# Altium footprint library Pcb.PcbLib: 234 footprints (part 14 of 15)
Each footprint in its own frame and in the unit in brackets; x right, y up, seen from the top. Pads: shape width x height; smd on the part's side, far side on the other; paste and mask are expansions set on the pad; w line width, h text height; cw(c..) or ccw(c..) is an arc to the next point about the centre after c.
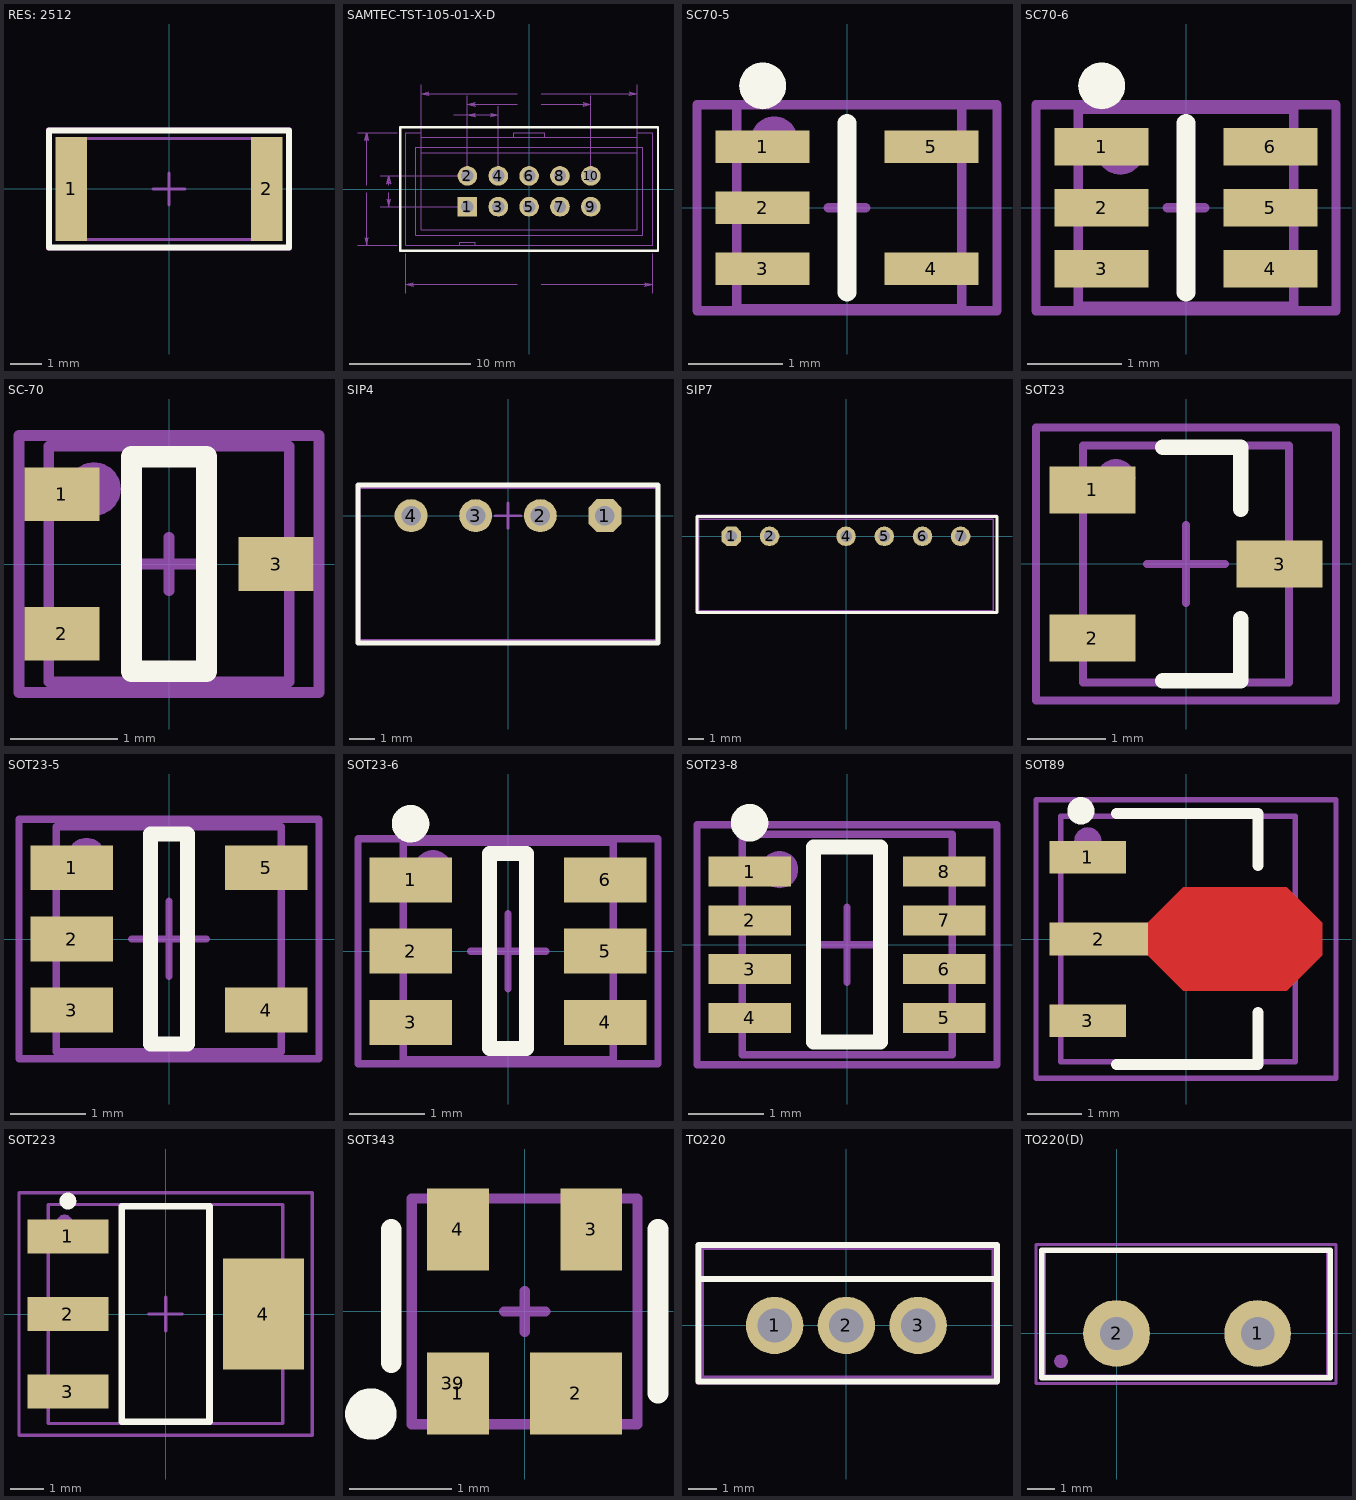
[diagram p13: the footprints below, top view; thin cyan lines are the x and y axes]

## RES: 2512 [mm]
height 0.55
pads (2):
  rect 1x3.3 smd: 1(-3.1,0) 2(3.1,0)
Top Overlay:
  lines w0.2: -3.8,-1.85 -3.8,1.85 3.8,1.85 3.8,-1.85 -3.8,-1.85
Mechanical 1:
  lines w0.1: -3.175,-1.6 -3.175,1.6 3.175,1.6 3.175,-1.6 -3.175,-1.6
Top Courtyard:
  lines w0.1: -0.5,0 0.5,0 ; 0,-0.5 0,0.5 ; -3.85,-1.9 3.85,-1.9 3.85,1.9 -3.85,1.9 -3.85,-1.9
3D body "chip_2512_r.STEP": height 0.52, standoff -0.04, extent -3.175,-1.6 3.175,1.6

## SAMTEC-TST-105-01-X-D [mm]
pads (10):
  rect 1.62x1.62 / inner round 1.524 / far side round 1.62 hole 1.02: 1(-5.08,-1.46)
  round 1.62 / inner round 1.524 / far side round 1.62 hole 1.02: 2(-5.08,1.08) 3(-2.54,-1.46) 4(-2.54,1.08) 5(0,-1.46) 6(0,1.08) 7(2.54,-1.46) 8(2.54,1.08) 9(5.08,-1.46) 10(5.08,1.08)
Top Overlay:
  lines w0.2: -10.61,-5.086 -10.61,5.086 10.61,5.086 10.61,-5.086 -10.61,-5.086
Top Solder:
  circle w0: c5.08,1.08 r0.861
  circle w0: c5.08,-1.46 r0.861
  circle w0: c2.54,1.08 r0.861
  circle w0: c2.54,-1.46 r0.861
  circle w0: c0,1.08 r0.861
  circle w0: c0,-1.46 r0.861
  circle w0: c-2.54,1.08 r0.861
  circle w0: c-2.54,-1.46 r0.861
  circle w0: c-5.08,1.08 r0.861
  circle w0: c-5.08,-1.46 r0.861
Bottom Solder:
  circle w0: c5.08,1.08 r0.861
  circle w0: c5.08,-1.46 r0.861
  circle w0: c2.54,1.08 r0.861
  circle w0: c2.54,-1.46 r0.861
  circle w0: c0,1.08 r0.861
  circle w0: c0,-1.46 r0.861
  circle w0: c-2.54,1.08 r0.861
  circle w0: c-2.54,-1.46 r0.861
  circle w0: c-5.08,1.08 r0.861
  circle w0: c-5.08,-1.46 r0.861
Mechanical 3:
  lines w0.1: -5.715,-4.636 -5.715,-4.382 ; -5.715,-4.636 -5.715,-4.382 ; -5.715,-4.636 -4.445,-4.636 ; -5.715,-4.636 -10.16,-4.636 -10.16,4.636 -8.89,4.636 -8.89,4.254 -3.81,4.254 -1.27,4.254 ; -5.715,-4.382 -4.445,-4.382 ; -5.715,-4.382 -4.445,-4.382 ; -4.445,-4.636 -3.81,-4.636 -1.27,-4.636 1.27,-4.636 3.81,-4.636 10.16,-4.636 10.16,4.636 8.89,4.636 8.89,4.254 3.81,4.254 1.27,4.254 ; -4.445,-4.636 -4.445,-4.382 ; -4.445,-4.636 -4.445,-4.382 ; -1.27,4.254 -1.27,4.636 1.27,4.636 1.27,4.254 ; -1.27,4.254 1.27,4.254 ; 4.762,0.762 5.398,0.762 ; 4.762,0.762 4.762,1.397 5.398,1.397 5.398,0.762 ; 4.762,0.762 5.398,0.762 ; -9.335,-3.81 -3.81,-3.81 -1.27,-3.81 1.27,-3.81 3.81,-3.81 9.335,-3.81 9.335,3.429 3.81,3.429 1.27,3.429 -1.27,3.429 -3.81,3.429 -9.335,3.429 -9.335,-3.81 ; -8.89,-3.366 -8.89,2.984 -3.81,2.984 -1.27,2.984 1.27,2.984 3.81,2.984 8.89,2.984 8.89,-3.366 3.81,-3.366 1.27,-3.366 -1.27,-3.366 -3.81,-3.366 -8.89,-3.366 ; -5.398,-1.778 -5.398,-1.143 -4.762,-1.143 -4.762,-1.778 -5.398,-1.778 ; -5.398,0.762 -4.762,0.762 -4.762,1.397 -5.398,1.397 -5.398,0.762 ; -2.858,-1.778 -2.222,-1.778 -2.222,-1.143 -2.858,-1.143 -2.858,-1.778 ; -2.858,0.762 -2.222,0.762 -2.222,1.397 -2.858,1.397 -2.858,0.762 ; -0.318,-1.778 0.318,-1.778 0.318,-1.143 -0.318,-1.143 -0.318,-1.778 ; -0.318,0.762 0.318,0.762 0.318,1.397 -0.318,1.397 -0.318,0.762 ; 2.222,-1.778 2.858,-1.778 2.858,-1.143 2.222,-1.143 2.222,-1.778 ; 2.222,0.762 2.858,0.762 2.858,1.397 2.222,1.397 2.222,0.762 ; 4.762,-1.778 4.762,-1.143 5.398,-1.143 5.398,-1.778 4.762,-1.778
Mechanical 30:
  lines w0: -14.087,-4.636 -10.861,-4.636 ; -14.087,4.636 -10.861,4.636 ; -13.386,-0.318 -13.386,-4.636 ; -13.386,0.318 -13.386,4.636 ; -12.258,-1.46 -5.781,-1.46 ; -12.258,1.08 -5.781,1.08 ; -11.557,-0.318 -11.557,-1.46 ; -11.557,0.318 -11.557,1.08 ; -10.16,-8.562 -10.16,-5.337 ; -8.89,0.701 -8.89,8.562 ; -6.198,6.096 -5.08,6.096 ; -5.08,6.797 -5.08,1.781 -5.08,7.686 ; -2.54,1.781 -2.54,6.797 ; -0.991,-7.861 -10.16,-7.861 ; -0.991,6.985 -5.08,6.985 ; -0.991,7.861 -8.89,7.861 ; 0.991,-7.861 10.16,-7.861 ; 0.991,6.985 5.08,6.985 ; 0.991,7.861 8.89,7.861 ; 5.08,1.781 5.08,7.686 ; 8.89,0.701 8.89,8.562 ; 10.16,-8.562 10.16,-5.337 ; -13.545,-4 -13.465,-4.064 -13.386,-4.636 ; -13.545,-4 -13.386,-4.128 ; -13.545,-4 -13.386,-4.636 ; -13.386,-4.636 -13.386,-4.128 ; -13.386,-4.636 -13.306,-4.064 -13.386,-4.128 ; -13.386,-4.636 -13.227,-4 -13.386,-4.128 ; -13.386,4.128 -13.386,4.636 ; -13.386,4.128 -13.465,4.064 -13.386,4.636 ; -13.386,4.128 -13.227,4 ; -13.386,4.128 -13.545,4 -13.386,4.636 ; -13.386,4.636 -13.306,4.064 -13.227,4 ; -13.386,4.636 -13.227,4 ; -11.716,-0.826 -11.636,-0.889 -11.557,-1.46 ; -11.716,-0.826 -11.557,-0.952 ; -11.716,-0.826 -11.557,-1.46 ; -11.557,-1.46 -11.557,-0.952 ; -11.557,-1.46 -11.478,-0.889 -11.557,-0.952 ; -11.557,-1.46 -11.398,-0.826 -11.557,-0.952 ; -11.557,0.572 -11.557,1.08 ; -11.557,0.572 -11.636,0.508 -11.557,1.08 ; -11.557,0.572 -11.398,0.444 ; -11.557,0.572 -11.716,0.444 -11.557,1.08 ; -11.557,1.08 -11.478,0.508 -11.398,0.444 ; -11.557,1.08 -11.398,0.444 ; -10.16,-7.861 -9.588,-7.782 -9.525,-7.703 ; -10.16,-7.861 -9.652,-7.861 ; -10.16,-7.861 -9.588,-7.941 -9.652,-7.861 ; -10.16,-7.861 -9.525,-8.02 -9.652,-7.861 ; -10.16,-7.861 -9.525,-7.703 ; -9.652,-7.861 -9.525,-7.703 ; -8.89,7.861 -8.318,7.941 -8.255,8.02 ; -8.89,7.861 -8.382,7.861 ; -8.89,7.861 -8.318,7.782 -8.382,7.861 ; -8.89,7.861 -8.255,7.703 -8.382,7.861 ; -8.89,7.861 -8.255,8.02 ; -8.382,7.861 -8.255,8.02 ; -5.08,6.096 -2.54,6.096 ; -5.08,6.096 -4.508,6.175 -4.445,6.255 ; -5.08,6.096 -4.572,6.096 ; -5.08,6.096 -4.508,6.017 -4.572,6.096 ; -5.08,6.096 -4.445,5.937 -4.572,6.096 ; -5.08,6.096 -4.445,6.255 ; -5.08,6.985 -4.508,7.064 -4.445,7.144 ; -5.08,6.985 -4.572,6.985 ; -5.08,6.985 -4.508,6.906 -4.572,6.985 ; -5.08,6.985 -4.445,6.826 -4.572,6.985 ; -5.08,6.985 -4.445,7.144 ; -4.572,6.096 -4.445,6.255 ; -4.572,6.985 -4.445,7.144 ; -3.175,5.937 -3.112,6.017 -2.54,6.096 ; -3.175,5.937 -3.048,6.096 ; -3.175,5.937 -2.54,6.096 ; -3.048,6.096 -2.54,6.096 ; -3.048,6.096 -3.112,6.175 -2.54,6.096 ; -3.048,6.096 -3.175,6.255 -2.54,6.096 ; 4.445,6.826 4.508,6.906 5.08,6.985 ; 4.445,6.826 4.572,6.985 ; 4.445,6.826 5.08,6.985 ; 4.572,6.985 5.08,6.985 ; 4.572,6.985 4.508,7.064 5.08,6.985 ; 4.572,6.985 4.445,7.144 5.08,6.985 ; 8.255,7.703 8.318,7.782 8.89,7.861 ; 8.255,7.703 8.382,7.861 ; 8.255,7.703 8.89,7.861 ; 8.382,7.861 8.89,7.861 ; 8.382,7.861 8.318,7.941 8.89,7.861 ; 8.382,7.861 8.255,8.02 8.89,7.861 ; 9.525,-8.02 9.588,-7.941 10.16,-7.861 ; 9.525,-8.02 9.652,-7.861 ; 9.525,-8.02 10.16,-7.861 ; 9.652,-7.861 10.16,-7.861 ; 9.652,-7.861 9.588,-7.782 10.16,-7.861 ; 9.652,-7.861 9.525,-7.703 10.16,-7.861
  text "17.780" at -0.8,7.734 h0.39
  text "10.160" at -0.8,6.858 h0.39
  text "20.320" at -0.8,-7.988 h0.39
  text "2.540" at -7.709,5.969 h0.39
  text "2.540" at -12.217,-0.127 h0.39
  text "9.271" at -14.046,-0.127 h0.39
Mechanical 32:
  lines w0.1: -10.61,-5.086 10.61,-5.086 10.61,5.086 -10.61,5.086 -10.61,-5.086
3D body "TST-105-01-G-D.stp": height 8.89, standoff -3.3, extent -10.16,-4.572 10.16,4.699

## SC70-5 [mm] "pitch 0.95 mm"
height 1.45
pads (7):
  rect 1x0.35 smd: 1(-0.9,0.65) 2(-0.9,0) 3(-0.9,-0.65) 4(0.9,-0.65) 5(0.9,0.65)
  round 0.5 on Top Overlay: ""(-0.9,1.3)
  round 0.5 on Mech1: ""(-0.775,0.725)
Top Overlay:
  lines w0.2: 0,-0.9 0,0.9
Mechanical 1:
  lines w0.1: -1.175,-1.075 -1.175,1.1 1.225,1.1 1.225,-1.075 -1.175,-1.075
Top Courtyard:
  lines w0.1: -0.2,0 0.2,0 ; 0,-0.2 0,0.2 ; -1.6,-1.1 1.6,-1.1 1.6,1.1 -1.6,1.1 -1.6,-1.1
3D body "User Library-SC70-5-MAX.STEP": height 1.09, standoff -0.01, extent -1.175,-1.1 1.225,1.1

## SC70-6 [mm] "SOT23, 5-Leads, Body 2,90x2,80mm, Pitch 0,95mm, IPC Medium Density"
height 1.45
pads (8):
  rect 1x0.4 smd: 1(-0.9,0.65) 2(-0.9,0) 3(-0.9,-0.65) 4(0.9,-0.65) 5(0.9,0) 6(0.9,0.65)
  round 0.5 on Top Overlay: ""(-0.9,1.3)
  round 0.5 on Mech1: ""(-0.7,0.6)
Top Overlay:
  lines w0.2: 0,-0.9 0,0.9
Mechanical 1:
  lines w0.1: -1.15,-1.05 1.15,-1.05 1.15,1.05 -1.15,1.05 -1.15,-1.05
Top Courtyard:
  lines w0.1: -0.2,0 0.2,0 ; 0,-0.2 0,0.2 ; -1.6,-1.1 -1.6,1.1 1.6,1.1 1.6,-1.1 -1.6,-1.1
3D body "User Library-sot363.STEP": height 1, standoff 0, extent -1.15,-1.05 1.15,1.05

## SC-70 [mm]
pads (4):
  rect 0.7x0.5 smd: 1(-1,0.65) 2(-1,-0.65) 3(1,0)
  round 0.5 on Mech1: ""(-0.7,0.7)
Top Overlay:
  lines w0.2: -0.35,-1 -0.35,1 0.35,1 0.35,-1 -0.35,-1
Mechanical 1:
  lines w0.1: -1.123,-1.1 -1.123,1.1 1.123,1.1 1.123,-1.1 -1.123,-1.1
Top Courtyard:
  lines w0.1: -0.25,0 0.25,0 ; 0,-0.25 0,0.25 ; -1.4,-1.2 1.4,-1.2 1.4,1.2 -1.4,1.2 -1.4,-1.2
3D body "User Library-SOT323 (SC70-3)-1.STEP": height 1.1, standoff 0, extent -1.123,-1.1 1.123,1.1

## SIP4 [mm]
height 15
pads (4):
  oct 1.3x1.3 hole 0.762: 1(3.81,0)
  round 1.3 hole 0.762: 2(1.27,0) 3(-1.27,0) 4(-3.81,0)
Top Overlay:
  lines w0.2: -5.9,-5 -5.9,1.2 5.9,1.2 5.9,-5 -5.9,-5
Mechanical 1:
  lines w0.1: -5.842,-4.9 -5.842,1.1 5.842,1.1 5.842,-4.9 -5.842,-4.9
Top Courtyard:
  lines w0.1: -0.5,0 0.5,0 ; 0,-0.5 0,0.5 ; -5.9,-5 5.9,-5 5.9,1.2 -5.9,1.2 -5.9,-5
3D body "P6AU.STEP": height 10, standoff -3, extent -5.84,-4.905 5.84,1.095

## SIP7 [mm]
height 15
pads (6):
  oct 1.3x1.3 hole 0.762: 1(-7.62,0)
  round 1.3 hole 0.762: 2(-5.08,0) 4(0,0) 5(2.54,0) 6(5.08,0) 7(7.62,0)
Top Overlay:
  lines w0.2: -9.906,-5.08 -9.906,1.3 10.033,1.3 10.033,-5.08 -9.906,-5.08
Mechanical 1:
  lines w0.1: -9.779,-4.953 -9.779,1.143 9.779,1.143 9.779,-4.953 -9.779,-4.953
Top Courtyard:
  lines w0.1: -0.5,0 0.5,0 ; 0,-0.5 0,0.5 ; -9.906,-5.08 10.033,-5.08 10.033,1.397 -9.906,1.397 -9.906,-5.08
3D body "SIP-7(124567).STEP": height 10, standoff -2.5, extent -9.72,-4.9 9.78,1.15

## SOT23 [mm]
height 1.1
pads (4):
  rect 1.1x0.6 smd: 1(-1.2,0.95) 2(-1.2,-0.95) 3(1.2,0)
  round 0.5 on Mech1: ""(-0.9,1.1)
Top Overlay:
  lines w0.2: -0.3,-1.5 0.7,-1.5 0.7,-0.7 ; -0.3,1.5 0.7,1.5 0.7,0.7
Mechanical 1:
  lines w0.1: -1.32,-1.52 1.32,-1.52 1.32,1.52 -1.32,1.52 -1.32,-1.52
Top Courtyard:
  lines w0.1: -0.5,0 0.5,0 ; 0,-0.5 0,0.5 ; -1.925,-1.75 -1.925,1.75 1.925,1.75 1.925,-1.75 -1.925,-1.75
3D body "SOT95P237X112-3N.step": height 1.12, standoff 0, extent -1.32,-1.52 1.32,1.52

## SOT23-5 [mm] "pitch 0.95 mm"
height 1.45
pads (6):
  rect 1.1x0.6 smd: 1(-1.3,0.95) 2(-1.3,0) 3(-1.3,-0.95) 4(1.3,-0.95) 5(1.3,0.95)
  round 0.5 on Mech1: ""(-1.1,1.1)
Top Overlay:
  lines w0.2: -0.25,-1.4 0.25,-1.4 0.25,1.4 -0.25,1.4 -0.25,-1.4
Mechanical 1:
  lines w0.1: -1.5,-1.5 -1.5,1.5 1.5,1.5 1.5,-1.5 -1.5,-1.5
Top Courtyard:
  lines w0.1: -0.5,0 0.5,0 ; 0,-0.5 0,0.5 ; -2,-1.6 -2,1.6 2,1.6 2,-1.6 -2,-1.6
3D body "SOT23-5-1.step": height 1.3, standoff 0, extent -1.5,-1.5 1.5,1.5

## SOT23-6 [mm] "pitch 0.95 mm"
height 1.1
pads (7):
  rect 1.1x0.6 smd: 1(-1.3,0.95) 2(-1.3,0) 3(-1.3,-0.95) 4(1.3,-0.95) 5(1.3,0) 6(1.3,0.95)
  round 0.5 on Mech1: ""(-1,1.1)
Top Overlay:
  circle w0.25: c-1.3,1.7 r0.125
  lines w0.2: -0.25,-1.3 0.25,-1.3 0.25,1.3 -0.25,1.3 -0.25,-1.3
Mechanical 1:
  lines w0.1: -1.4,-1.45 -1.4,1.45 1.4,1.45 1.4,-1.45 -1.4,-1.45
Top Courtyard:
  lines w0.1: -0.5,0 0.5,0 ; 0,-0.5 0,0.5 ; -2,-1.5 -2,1.5 2,1.5 2,-1.5 -2,-1.5
3D body "User Library-SOT23-6-2.STEP": height 1.45, standoff 0, extent -1.4,-1.45 1.4,1.45

## SOT23-8 [mm] "pitch 0.95 mm"
height 1.45
pads (9):
  rect 1.1x0.4 smd: 1(-1.3,0.975) 2(-1.3,0.325) 3(-1.3,-0.325) 4(-1.3,-0.975) 5(1.3,-0.975) 6(1.3,-0.325) 7(1.3,0.325) 8(1.3,0.975)
  round 0.5 on Mech1: ""(-0.9,1)
Top Overlay:
  circle w0.25: c-1.3,1.625 r0.125
  lines w0.2: -0.45,-1.3 0.45,-1.3 0.45,1.3 -0.45,1.3 -0.45,-1.3
Mechanical 1:
  lines w0.1: -1.4,-1.47 1.4,-1.47 1.4,1.47 -1.4,1.47 -1.4,-1.47
Top Courtyard:
  lines w0.1: -0.5,0 0.5,0 ; 0,-0.5 0,0.5 ; -2,-1.6 2,-1.6 2,1.6 -2,1.6 -2,-1.6
3D body "User Library-sot238.STEP": height 1.2, standoff 0, extent -1.4,-1.495 1.4,1.445

## SOT89 [mm]
height 1.6
pads (4):
  rect 1.4x0.6 smd: 1(-1.8,1.5) 3(-1.8,-1.5)
  rect 1.8x0.6 smd: 2(-1.6,0)
  round 0.5 on Mech1: ""(-1.8,1.8)
Top Layer:
  region: -0.7,0.3 -0.05,0.95 1.85,0.95 2.5,0.3 2.5,-0.3 1.85,-0.95 -0.05,-0.95 -0.7,-0.3
Top Overlay:
  circle w0.25: c-1.927,2.35 r0.125
  lines w0.2: -1.278,-2.3 1.322,-2.3 1.322,-1.35 ; -1.278,2.3 1.322,2.3 1.322,1.35
Mechanical 1:
  lines w0.1: -2.3,-2.25 2,-2.25 2,2.25 -2.3,2.25 -2.3,-2.25
Top Courtyard:
  lines w0.1: -0.477,0 0.523,0 ; 0.022,-0.5 0.022,0.5 ; -2.75,-2.55 -2.75,2.55 2.75,2.55 2.75,-2.55 -2.75,-2.55
3D body "SOT-89.step": height 1.51, standoff 0, extent -2.3,-2.25 2,2.25

## SOT223 [mm] "SOT223, 4-Leads, Body 6,50x7,00mm (avg), Pitch 2,30mm, IPC Medium Density"
height 1.8
pads (5):
  rect 2.4x1 smd: 1(-2.9,2.3) 2(-2.9,0) 3(-2.9,-2.3)
  rect 2.4x3.3 smd: 4(2.9,0)
  round 0.5 on Mech1: ""(-3,2.7)
Top Overlay:
  circle w0.25: c-2.9,3.35 r0.125
  lines w0.2: -1.3,-3.2 1.3,-3.2 1.3,3.2 -1.3,3.2 -1.3,-3.2
Mechanical 1:
  lines w0.1: -3.48,-3.25 -3.48,3.25 3.48,3.25 3.48,-3.25 -3.48,-3.25
Top Courtyard:
  lines w0.1: -0.5,0 0.5,0 ; 0,-0.5 0,0.5 ; -4.35,-3.6 4.35,-3.6 4.35,3.6 -4.35,3.6 -4.35,-3.6
3D body "SOT-223-3.step": height 1.65, standoff -0.03, extent -3.48,-3.25 3.48,3.25

## SOT343 [mm]
height 0.9
pads (5):
  rect 0.6x0.8 smd: 1(-0.65,-0.8) 3(0.65,0.8) 4(-0.65,0.8)
  rect 0.9x0.8 smd: 2(0.5,-0.8)
  round 0.5 on Mech1: 39(-0.7,-0.7)
Top Overlay:
  circle w0.25: c-1.5,-1 r0.125
  lines w0.2: -1.3,-0.5 -1.3,0.8 ; 1.3,-0.8 1.3,0.8
Mechanical 1:
  lines w0.1: -1.1,-1.1 1.1,-1.1 1.1,1.1 -1.1,1.1 -1.1,-1.1
Top Courtyard:
  lines w0.1: -0.2,0 0.2,0 ; 0,-0.2 0,0.2 ; -1.1,-1.1 1.1,-1.1 1.1,1.1 -1.1,1.1 -1.1,-1.1
3D body "User Library-SOT343-1.STEP": height 1, standoff 0, extent -1.1,-1.1 1.1,1.1

## TO220 [mm]
height 22
pads (3):
  round 2 hole 1.2: 1(-2.5,0) 2(0,0) 3(2.5,0)
Top Overlay:
  lines w0.2: -5.15,1.619 5.247,1.619 ; -5.15,-1.95 -5.15,2.8 5.247,2.8 5.247,-1.95 -5.15,-1.95
Mechanical 1:
  lines w0.1: -5,1.6 5.1,1.6 ; -5,-1.8 5.1,-1.8 5.1,2.675 -5,2.675 -5,-1.8
Top Courtyard:
  lines w0.1: -0.5,0 0.5,0 ; 0,-0.5 0,0.5 ; -5.2,-2 -5.2,2.8 5.247,2.8 5.247,-2 -5.2,-2
3D body "User Library-TO-220-4.STEP": height 22.06, standoff -6.74, extent -5,-1.8 5.2,2.7

## TO220(D) [mm]
pads (3):
  round 2.4 hole 1.2: 1(5.08,0) 2(0,0)
  round 0.5 on Mech1: ""(-2,-1)
Top Overlay:
  lines w0.2: -2.7,-1.6 -2.7,3 7.7,3 7.7,-1.6 -2.7,-1.6
Mechanical 1:
  lines w0.1: -2.59,-1.533 -2.59,2.977 7.59,2.977 7.59,-1.533 -2.59,-1.533
Top Courtyard:
  lines w0.1: -2.9,-1.8 7.9,-1.8 7.9,3.2 -2.9,3.2 -2.9,-1.8
3D body "TO-220FPAC.stp": height 21.15, standoff -8.45, extent -2.59,-1.533 7.59,2.977